# Altium footprint library domino-rising-cage-clamp.PcbLib: 435 footprints (part 17 of 28)
Each footprint in its own frame and in the unit in brackets; x right, y up, seen from the top. Pads: shape width x height; smd on the part's side, far side on the other; paste and mask are expansions set on the pad; w line width, h text height; cw(c..) or ccw(c..) is an arc to the next point about the centre after c.
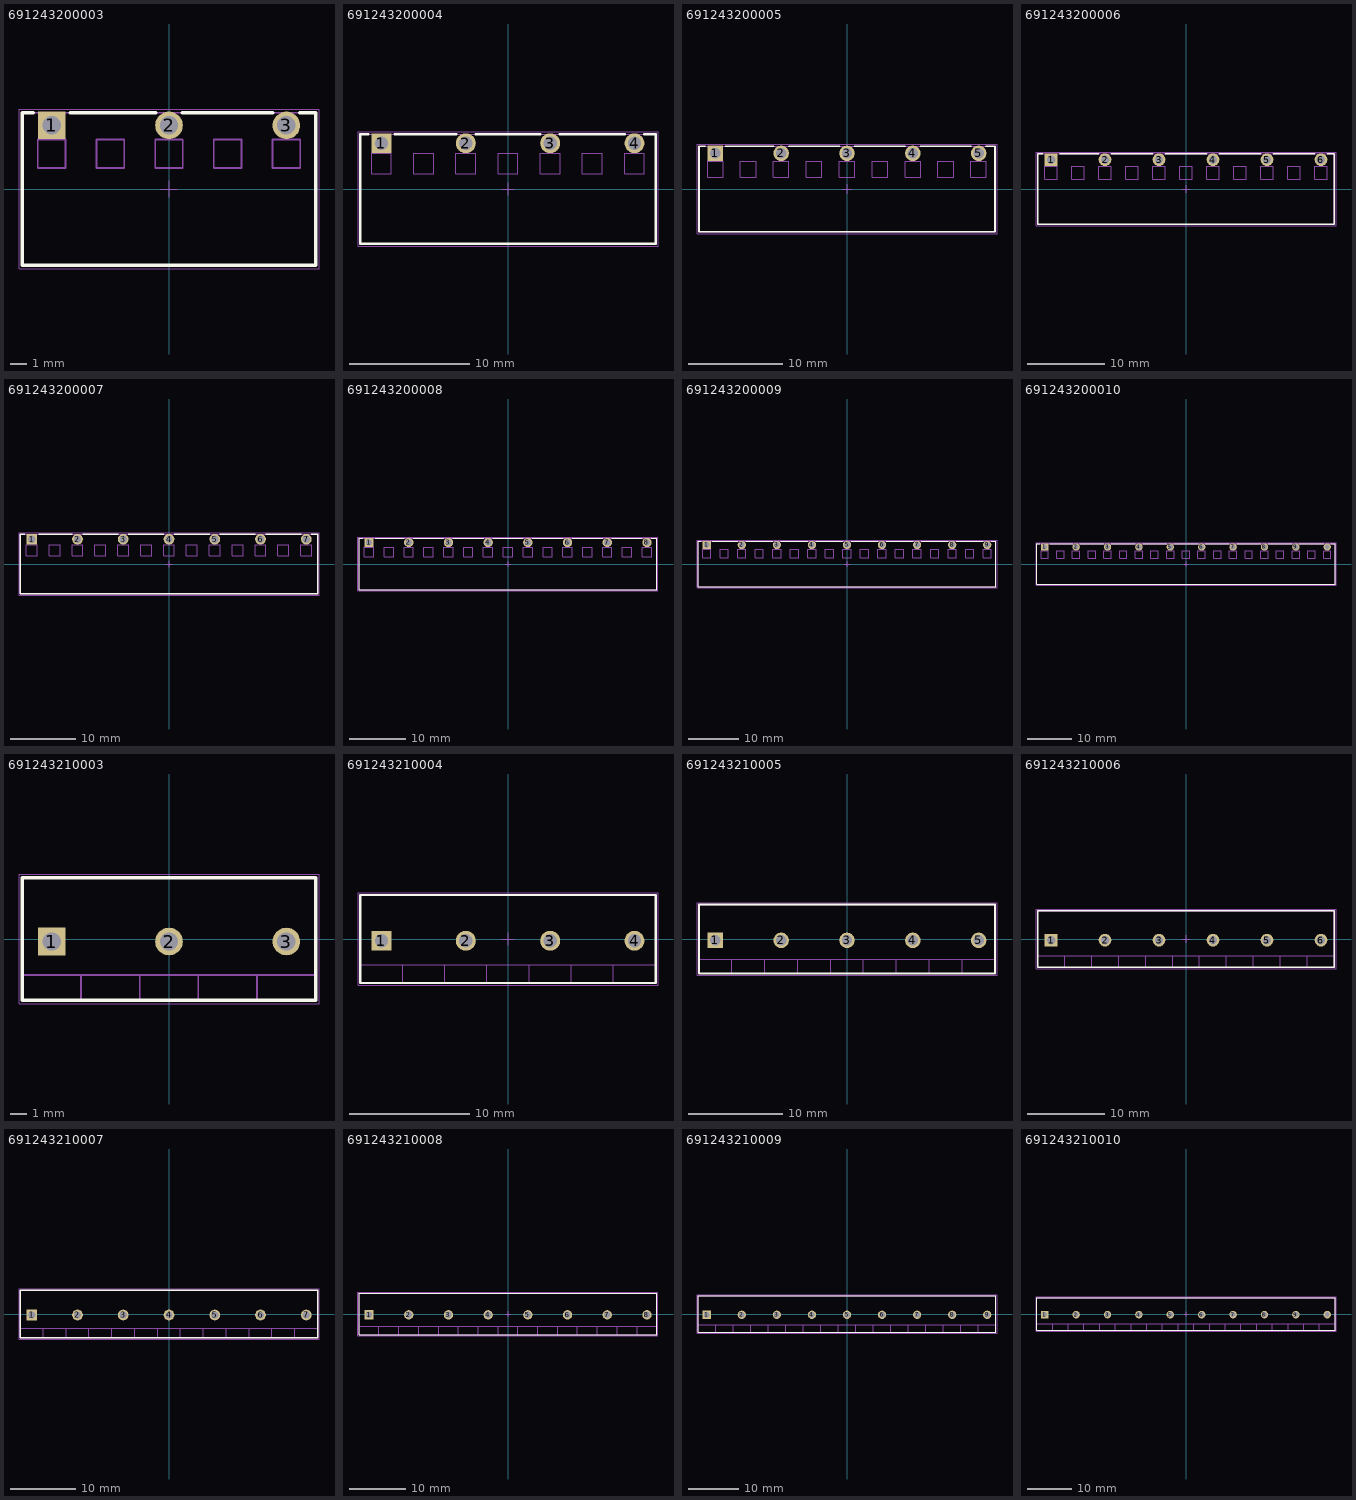
[diagram p16: the footprints below, top view; thin cyan lines are the x and y axes]

## 691243200003 [mm] "Serie 2432 - 7.00 mm _ 3 pins"
height 7.3
pads (3):
  rect 1.65x1.65 hole 1.1: 1(-7,3.8)
  round 1.65 hole 1.1: 2(0,3.8) 3(7,3.8)
Top Overlay:
  lines w0.2: -8.1,4.55 -8.75,4.55 -8.75,-4.55 8.75,-4.55 8.75,4.55 7.8,4.55 ; -5.9,4.55 -0.8,4.55 ; 0.8,4.55 6.2,4.55
Mechanical 13:
  lines w0.1: -8.75,-4.55 -8.75,4.55 8.75,4.55 8.75,-4.55 -8.75,-4.55 ; -7.825,1.25 -6.175,1.25 -6.175,2.95 -7.825,2.95 -7.825,1.25 ; -4.325,1.25 -4.325,2.95 -2.675,2.95 -2.675,1.25 -4.325,1.25 ; -0.825,1.25 -0.825,2.95 0.825,2.95 0.825,1.25 -0.825,1.25 ; 2.675,1.25 2.675,2.95 4.325,2.95 4.325,1.25 2.675,1.25 ; 6.175,1.25 6.175,2.95 7.825,2.95 7.825,1.25 6.175,1.25
Mechanical 15:
  lines w0.05: -0.5,0 0.5,0 ; 0,-0.5 0,0.5 ; -8.95,-4.75 -8.95,4.75 8.95,4.75 8.95,-4.75 -8.95,-4.75
3D body "691243200003.stp": height 7.4, standoff -3.4, extent -8.75,-4.55 8.75,4.55

## 691243200004 [mm] "Serie 2432 - 7.00 mm _ 4 pins"
height 7.3
pads (4):
  rect 1.65x1.65 hole 1.1: 1(-10.5,3.8)
  round 1.65 hole 1.1: 2(-3.5,3.8) 3(3.5,3.8) 4(10.5,3.8)
Top Overlay:
  lines w0.2: -11.6,4.55 -12.25,4.55 -12.25,-4.55 12.25,-4.55 12.25,4.55 11.3,4.55 ; -9.4,4.55 -4.3,4.55 ; -2.7,4.55 2.7,4.55 ; 4.3,4.55 9.7,4.55
Mechanical 13:
  lines w0.1: -12.25,-4.55 -12.25,4.55 12.25,4.55 12.25,-4.55 -12.25,-4.55 ; -11.325,1.25 -9.675,1.25 -9.675,2.95 -11.325,2.95 -11.325,1.25 ; -7.825,1.25 -7.825,2.95 -6.175,2.95 -6.175,1.25 -7.825,1.25 ; -4.325,1.25 -4.325,2.95 -2.675,2.95 -2.675,1.25 -4.325,1.25 ; -0.825,1.25 -0.825,2.95 0.825,2.95 0.825,1.25 -0.825,1.25 ; 2.675,1.25 2.675,2.95 4.325,2.95 4.325,1.25 2.675,1.25 ; 6.175,1.25 6.175,2.95 7.825,2.95 7.825,1.25 6.175,1.25 ; 9.675,1.25 11.325,1.25 11.325,2.95 9.675,2.95 9.675,1.25
Mechanical 15:
  lines w0.05: -0.5,0 0.5,0 ; 0,-0.5 0,0.5 ; -12.45,-4.75 -12.45,4.75 12.45,4.75 12.45,-4.75 -12.45,-4.75
3D body "691243200004.stp": height 7.4, standoff -3.4, extent -12.25,-4.55 12.25,4.55

## 691243200005 [mm] "Serie 2432 - 7.00 mm _ 5 pins"
height 7.3
pads (5):
  rect 1.65x1.65 hole 1.1: 1(-14,3.8)
  round 1.65 hole 1.1: 2(-7,3.8) 3(0,3.8) 4(7,3.8) 5(14,3.8)
Top Overlay:
  lines w0.2: -15.1,4.55 -15.75,4.55 -15.75,-4.55 15.75,-4.55 15.75,4.55 14.8,4.55 ; -12.9,4.55 -7.8,4.55 ; -6.2,4.55 -0.8,4.55 ; 0.8,4.55 6.2,4.55 ; 7.8,4.55 13.2,4.55
Mechanical 13:
  lines w0.1: -15.75,-4.55 -15.75,4.55 15.75,4.55 15.75,-4.55 -15.75,-4.55 ; -14.825,1.25 -13.175,1.25 -13.175,2.95 -14.825,2.95 -14.825,1.25 ; -11.325,1.25 -9.675,1.25 -9.675,2.95 -11.325,2.95 -11.325,1.25 ; -7.825,1.25 -7.825,2.95 -6.175,2.95 -6.175,1.25 -7.825,1.25 ; -4.325,1.25 -2.675,1.25 -2.675,2.95 -4.325,2.95 -4.325,1.25 ; -0.825,1.25 -0.825,2.95 0.825,2.95 0.825,1.25 -0.825,1.25 ; 2.675,1.25 4.325,1.25 4.325,2.95 2.675,2.95 2.675,1.25 ; 6.175,1.25 7.825,1.25 7.825,2.95 6.175,2.95 6.175,1.25 ; 9.675,1.25 11.325,1.25 11.325,2.95 9.675,2.95 9.675,1.25 ; 13.175,1.25 13.175,2.95 14.825,2.95 14.825,1.25 13.175,1.25
Mechanical 15:
  lines w0.05: -0.5,0 0.5,0 ; 0,-0.5 0,0.5 ; -15.95,-4.75 -15.95,4.75 15.95,4.75 15.95,-4.75 -15.95,-4.75
3D body "691243200005.stp": height 7.4, standoff -3.4, extent -15.75,-4.55 15.75,4.55

## 691243200006 [mm] "Serie 2432 - 7.00 mm _ 6 pins"
height 7.3
pads (6):
  rect 1.65x1.65 hole 1.1: 1(-17.5,3.8)
  round 1.65 hole 1.1: 2(-10.5,3.8) 3(-3.5,3.8) 4(3.5,3.8) 5(10.5,3.8) 6(17.5,3.8)
Top Overlay:
  lines w0.2: -18.6,4.55 -19.25,4.55 -19.25,-4.55 19.25,-4.55 19.25,4.55 18.3,4.55 ; -16.4,4.55 -11.3,4.55 ; -9.7,4.55 -4.3,4.55 ; -2.7,4.55 2.7,4.55 ; 4.3,4.55 9.7,4.55 ; 11.3,4.55 16.7,4.55
Mechanical 13:
  lines w0.1: -19.25,-4.55 -19.25,4.55 19.25,4.55 19.25,-4.55 -19.25,-4.55 ; -18.325,1.25 -16.675,1.25 -16.675,2.95 -18.325,2.95 -18.325,1.25 ; -14.825,1.25 -14.825,2.95 -13.175,2.95 -13.175,1.25 -14.825,1.25 ; -11.325,1.25 -11.325,2.95 -9.675,2.95 -9.675,1.25 -11.325,1.25 ; -7.825,1.25 -7.825,2.95 -6.175,2.95 -6.175,1.25 -7.825,1.25 ; -4.325,1.25 -4.325,2.95 -2.675,2.95 -2.675,1.25 -4.325,1.25 ; -0.825,1.25 -0.825,2.95 0.825,2.95 0.825,1.25 -0.825,1.25 ; 2.675,1.25 4.325,1.25 4.325,2.95 2.675,2.95 2.675,1.25 ; 6.175,1.25 6.175,2.95 7.825,2.95 7.825,1.25 6.175,1.25 ; 9.675,1.25 9.675,2.95 11.325,2.95 11.325,1.25 9.675,1.25 ; 13.175,1.25 13.175,2.95 14.825,2.95 14.825,1.25 13.175,1.25 ; 16.675,1.25 18.325,1.25 18.325,2.95 16.675,2.95 16.675,1.25
Mechanical 15:
  lines w0.05: -0.5,0 0.5,0 ; 0,-0.5 0,0.5 ; -19.45,-4.75 -19.45,4.75 19.45,4.75 19.45,-4.75 -19.45,-4.75
3D body "691243200006.stp": height 7.4, standoff -3.4, extent -19.25,-4.55 19.25,4.55

## 691243200007 [mm] "Serie 2432 - 7.00 mm _ 7 pins"
height 7.3
pads (7):
  rect 1.65x1.65 hole 1.1: 1(-21,3.8)
  round 1.65 hole 1.1: 2(-14,3.8) 3(-7,3.8) 4(0,3.8) 5(7,3.8) 6(14,3.8) 7(21,3.8)
Top Overlay:
  lines w0.2: -22.1,4.55 -22.75,4.55 -22.75,-4.55 22.75,-4.55 22.75,4.55 21.8,4.55 ; -19.9,4.55 -14.8,4.55 ; -13.2,4.55 -7.8,4.55 ; -6.2,4.55 -0.8,4.55 ; 0.8,4.55 6.2,4.55 ; 7.8,4.55 13.2,4.55 ; 14.8,4.55 20.2,4.55
Mechanical 13:
  lines w0.1: -22.75,-4.55 22.75,-4.55 22.75,4.55 -22.75,4.55 -22.75,-4.55 ; -21.825,1.25 -21.825,2.95 -20.175,2.95 -20.175,1.25 -21.825,1.25 ; -18.325,1.25 -18.325,2.95 -16.675,2.95 -16.675,1.25 -18.325,1.25 ; -14.825,1.25 -13.175,1.25 -13.175,2.95 -14.825,2.95 -14.825,1.25 ; -11.325,1.25 -11.325,2.95 -9.675,2.95 -9.675,1.25 -11.325,1.25 ; -7.825,1.25 -6.175,1.25 -6.175,2.95 -7.825,2.95 -7.825,1.25 ; -4.325,1.25 -4.325,2.95 -2.675,2.95 -2.675,1.25 -4.325,1.25 ; -0.825,1.25 -0.825,2.95 0.825,2.95 0.825,1.25 -0.825,1.25 ; 2.675,1.25 2.675,2.95 4.325,2.95 4.325,1.25 2.675,1.25 ; 6.175,1.25 7.825,1.25 7.825,2.95 6.175,2.95 6.175,1.25 ; 9.675,1.25 9.675,2.95 11.325,2.95 11.325,1.25 9.675,1.25 ; 13.175,1.25 13.175,2.95 14.825,2.95 14.825,1.25 13.175,1.25 ; 16.675,1.25 16.675,2.95 18.325,2.95 18.325,1.25 16.675,1.25 ; 20.175,1.25 21.825,1.25 21.825,2.95 20.175,2.95 20.175,1.25
Mechanical 15:
  lines w0.05: -0.5,0 0.5,0 ; 0,-0.5 0,0.5 ; -22.95,-4.75 22.95,-4.75 22.95,4.75 -22.95,4.75 -22.95,-4.75
3D body "691243200007.stp": height 7.4, standoff -3.4, extent -22.75,-4.55 22.75,4.55

## 691243200008 [mm] "Serie 2432 - 7.00 mm _ 8 pins"
height 7.3
pads (8):
  rect 1.65x1.65 hole 1.1: 1(-24.5,3.8)
  round 1.65 hole 1.1: 2(-17.5,3.8) 3(-10.5,3.8) 4(-3.5,3.8) 5(3.5,3.8) 6(10.5,3.8) 7(17.5,3.8) 8(24.5,3.8)
Top Overlay:
  lines w0.2: -25.6,4.55 -26.25,4.55 -26.25,-4.55 26.25,-4.55 26.25,4.55 25.3,4.55 ; -23.4,4.55 -18.3,4.55 ; -16.7,4.55 -11.3,4.55 ; -9.7,4.55 -4.3,4.55 ; -2.7,4.55 2.7,4.55 ; 4.3,4.55 9.7,4.55 ; 11.3,4.55 16.7,4.55 ; 18.3,4.55 23.7,4.55
Mechanical 13:
  lines w0.1: -26.25,-4.55 26.25,-4.55 26.25,4.55 -26.25,4.55 -26.25,-4.55 ; -25.325,1.25 -25.325,2.95 -23.675,2.95 -23.675,1.25 -25.325,1.25 ; -21.825,1.25 -20.175,1.25 -20.175,2.95 -21.825,2.95 -21.825,1.25 ; -18.325,1.25 -16.675,1.25 -16.675,2.95 -18.325,2.95 -18.325,1.25 ; -14.825,1.25 -13.175,1.25 -13.175,2.95 -14.825,2.95 -14.825,1.25 ; -11.325,1.25 -9.675,1.25 -9.675,2.95 -11.325,2.95 -11.325,1.25 ; -7.825,1.25 -6.175,1.25 -6.175,2.95 -7.825,2.95 -7.825,1.25 ; -4.325,1.25 -4.325,2.95 -2.675,2.95 -2.675,1.25 -4.325,1.25 ; -0.825,1.25 0.825,1.25 0.825,2.95 -0.825,2.95 -0.825,1.25 ; 2.675,1.25 4.325,1.25 4.325,2.95 2.675,2.95 2.675,1.25 ; 6.175,1.25 7.825,1.25 7.825,2.95 6.175,2.95 6.175,1.25 ; 9.675,1.25 9.675,2.95 11.325,2.95 11.325,1.25 9.675,1.25 ; 13.175,1.25 14.825,1.25 14.825,2.95 13.175,2.95 13.175,1.25 ; 16.675,1.25 18.325,1.25 18.325,2.95 16.675,2.95 16.675,1.25 ; 20.175,1.25 21.825,1.25 21.825,2.95 20.175,2.95 20.175,1.25 ; 23.675,1.25 23.675,2.95 25.325,2.95 25.325,1.25 23.675,1.25
Mechanical 15:
  lines w0.05: -0.5,0 0.5,0 ; 0,-0.5 0,0.5 ; -26.45,-4.75 26.45,-4.75 26.45,4.75 -26.45,4.75 -26.45,-4.75
3D body "691243200008.stp": height 7.4, standoff -3.4, extent -26.25,-4.55 26.25,4.55

## 691243200009 [mm] "Serie 2432 - 7.00 mm _ 9 pins"
height 7.3
pads (9):
  rect 1.65x1.65 hole 1.1: 1(-28,3.8)
  round 1.65 hole 1.1: 2(-21,3.8) 3(-14,3.8) 4(-7,3.8) 5(0,3.8) 6(7,3.8) 7(14,3.8) 8(21,3.8) 9(28,3.8)
Top Overlay:
  lines w0.2: -29.1,4.55 -29.75,4.55 -29.75,-4.55 29.75,-4.55 29.75,4.55 28.8,4.55 ; -26.9,4.55 -21.8,4.55 ; -20.2,4.55 -14.8,4.55 ; -13.2,4.55 -7.8,4.55 ; -6.2,4.55 -0.8,4.55 ; 0.8,4.55 6.2,4.55 ; 7.8,4.55 13.2,4.55 ; 14.8,4.55 20.2,4.55 ; 21.8,4.55 27.2,4.55
Mechanical 13:
  lines w0.1: -29.75,-4.55 29.75,-4.55 29.75,4.55 -29.75,4.55 -29.75,-4.55 ; -28.825,1.25 -28.825,2.95 -27.175,2.95 -27.175,1.25 -28.825,1.25 ; -25.325,1.25 -25.325,2.95 -23.675,2.95 -23.675,1.25 -25.325,1.25 ; -21.825,1.25 -20.175,1.25 -20.175,2.95 -21.825,2.95 -21.825,1.25 ; -18.325,1.25 -18.325,2.95 -16.675,2.95 -16.675,1.25 -18.325,1.25 ; -14.825,1.25 -13.175,1.25 -13.175,2.95 -14.825,2.95 -14.825,1.25 ; -11.325,1.25 -11.325,2.95 -9.675,2.95 -9.675,1.25 -11.325,1.25 ; -7.825,1.25 -7.825,2.95 -6.175,2.95 -6.175,1.25 -7.825,1.25 ; -4.325,1.25 -4.325,2.95 -2.675,2.95 -2.675,1.25 -4.325,1.25 ; -0.825,1.25 0.825,1.25 0.825,2.95 -0.825,2.95 -0.825,1.25 ; 2.675,1.25 2.675,2.95 4.325,2.95 4.325,1.25 2.675,1.25 ; 6.175,1.25 6.175,2.95 7.825,2.95 7.825,1.25 6.175,1.25 ; 9.675,1.25 9.675,2.95 11.325,2.95 11.325,1.25 9.675,1.25 ; 13.175,1.25 14.825,1.25 14.825,2.95 13.175,2.95 13.175,1.25 ; 16.675,1.25 16.675,2.95 18.325,2.95 18.325,1.25 16.675,1.25 ; 20.175,1.25 20.175,2.95 21.825,2.95 21.825,1.25 20.175,1.25 ; 23.675,1.25 23.675,2.95 25.325,2.95 25.325,1.25 23.675,1.25 ; 27.175,1.25 28.825,1.25 28.825,2.95 27.175,2.95 27.175,1.25
Mechanical 15:
  lines w0.05: -0.5,0 0.5,0 ; 0,-0.5 0,0.5 ; -29.95,-4.75 29.95,-4.75 29.95,4.75 -29.95,4.75 -29.95,-4.75
3D body "691243200009.stp": height 7.4, standoff -3.4, extent -29.75,-4.55 29.75,4.55

## 691243200010 [mm] "Serie 2432 - 7.00 mm _ 10 pins"
height 7.3
pads (10):
  rect 1.65x1.65 hole 1.1: 1(-31.5,3.8)
  round 1.65 hole 1.1: 2(-24.5,3.8) 3(-17.5,3.8) 4(-10.5,3.8) 5(-3.5,3.8) 6(3.5,3.8) 7(10.5,3.8) 8(17.5,3.8) 9(24.5,3.8) 10(31.5,3.8)
Top Overlay:
  lines w0.2: -32.6,4.55 -33.25,4.55 -33.25,-4.55 33.25,-4.55 33.25,4.55 32.3,4.55 ; -30.4,4.55 -25.3,4.55 ; -23.7,4.55 -18.3,4.55 ; -16.7,4.55 -11.3,4.55 ; -9.7,4.55 -4.3,4.55 ; -2.7,4.55 2.7,4.55 ; 4.3,4.55 9.7,4.55 ; 11.3,4.55 16.7,4.55 ; 18.3,4.55 23.7,4.55 ; 25.3,4.55 30.7,4.55
Mechanical 13:
  lines w0.1: -33.25,-4.55 -33.25,4.55 33.25,4.55 33.25,-4.55 -33.25,-4.55 ; -32.325,1.25 -30.675,1.25 -30.675,2.95 -32.325,2.95 -32.325,1.25 ; -28.825,1.25 -27.175,1.25 -27.175,2.95 -28.825,2.95 -28.825,1.25 ; -25.325,1.25 -25.325,2.95 -23.675,2.95 -23.675,1.25 -25.325,1.25 ; -21.825,1.25 -20.175,1.25 -20.175,2.95 -21.825,2.95 -21.825,1.25 ; -18.325,1.25 -18.325,2.95 -16.675,2.95 -16.675,1.25 -18.325,1.25 ; -14.825,1.25 -13.175,1.25 -13.175,2.95 -14.825,2.95 -14.825,1.25 ; -11.325,1.25 -9.675,1.25 -9.675,2.95 -11.325,2.95 -11.325,1.25 ; -7.825,1.25 -6.175,1.25 -6.175,2.95 -7.825,2.95 -7.825,1.25 ; -4.325,1.25 -4.325,2.95 -2.675,2.95 -2.675,1.25 -4.325,1.25 ; -0.825,1.25 0.825,1.25 0.825,2.95 -0.825,2.95 -0.825,1.25 ; 2.675,1.25 4.325,1.25 4.325,2.95 2.675,2.95 2.675,1.25 ; 6.175,1.25 7.825,1.25 7.825,2.95 6.175,2.95 6.175,1.25 ; 9.675,1.25 9.675,2.95 11.325,2.95 11.325,1.25 9.675,1.25 ; 13.175,1.25 14.825,1.25 14.825,2.95 13.175,2.95 13.175,1.25 ; 16.675,1.25 18.325,1.25 18.325,2.95 16.675,2.95 16.675,1.25 ; 20.175,1.25 21.825,1.25 21.825,2.95 20.175,2.95 20.175,1.25 ; 23.675,1.25 23.675,2.95 25.325,2.95 25.325,1.25 23.675,1.25 ; 27.175,1.25 28.825,1.25 28.825,2.95 27.175,2.95 27.175,1.25 ; 30.675,1.25 32.325,1.25 32.325,2.95 30.675,2.95 30.675,1.25
Mechanical 15:
  lines w0.05: -0.5,0 0.5,0 ; 0,-0.5 0,0.5 ; -33.45,-4.75 -33.45,4.75 33.45,4.75 33.45,-4.75 -33.45,-4.75
3D body "691243200010.stp": height 7.4, standoff -3.4, extent -33.25,-4.55 33.25,4.55

## 691243210003 [mm] "Serie 2432 - 7.00 mm _ 3 pins"
height 9.1
pads (3):
  rect 1.65x1.65 hole 1.1: 1(-7,-0.15)
  round 1.65 hole 1.1: 2(0,-0.15) 3(7,-0.15)
Top Overlay:
  lines w0.2: -8.75,-3.65 -8.75,3.65 8.75,3.65 8.75,-3.65 -8.75,-3.65
Mechanical 13:
  lines w0.1: -8.75,-2.15 8.75,-2.15 ; -5.25,-3.65 -5.25,-2.15 ; -1.75,-3.65 -1.75,-2.15 ; 1.75,-3.65 1.75,-2.15 ; 5.25,-3.65 5.25,-2.15 ; -8.75,-3.65 8.75,-3.65 8.75,3.65 -8.75,3.65 -8.75,-3.65
Mechanical 15:
  lines w0.05: -0.5,0 0.5,0 ; 0,-0.5 0,0.5 ; -8.95,-3.85 -8.95,3.85 8.95,3.85 8.95,-3.85 -8.95,-3.85
3D body "691243210003.stp": height 9.15, standoff -3.45, extent -8.75,-3.65 8.75,3.65

## 691243210004 [mm] "Serie 2432 - 7.00 mm _ 4 pins"
height 9.1
pads (4):
  rect 1.65x1.65 hole 1.1: 1(-10.5,-0.15)
  round 1.65 hole 1.1: 2(-3.5,-0.15) 3(3.5,-0.15) 4(10.5,-0.15)
Top Overlay:
  lines w0.2: -12.25,-3.65 12.25,-3.65 12.25,3.65 -12.25,3.65 -12.25,-3.65
Mechanical 13:
  lines w0.1: -12.25,-2.15 12.25,-2.15 ; -8.75,-3.65 -8.75,-2.15 ; -5.25,-3.65 -5.25,-2.15 ; -1.75,-3.65 -1.75,-2.15 ; 1.75,-3.65 1.75,-2.15 ; 5.25,-3.65 5.25,-2.15 ; 8.75,-3.65 8.75,-2.15 ; -12.25,-3.65 -12.25,3.65 12.25,3.65 12.25,-3.65 -12.25,-3.65
Mechanical 15:
  lines w0.05: -0.5,0 0.5,0 ; 0,-0.5 0,0.5 ; -12.45,-3.85 12.45,-3.85 12.45,3.85 -12.45,3.85 -12.45,-3.85
3D body "691243210004.stp": height 9.15, standoff -3.45, extent -12.25,-3.65 12.25,3.65

## 691243210005 [mm] "Serie 2432 - 7.00 mm _ 5 pins"
height 9.1
pads (5):
  rect 1.65x1.65 hole 1.1: 1(-14,-0.15)
  round 1.65 hole 1.1: 2(-7,-0.15) 3(0,-0.15) 4(7,-0.15) 5(14,-0.15)
Top Overlay:
  lines w0.2: -15.75,-3.65 15.75,-3.65 15.75,3.65 -15.75,3.65 -15.75,-3.65
Mechanical 13:
  lines w0.1: -15.75,-2.15 15.75,-2.15 ; -12.25,-3.65 -12.25,-2.15 ; -8.75,-3.65 -8.75,-2.15 ; -5.25,-3.65 -5.25,-2.15 ; -1.75,-3.65 -1.75,-2.15 ; 1.75,-3.65 1.75,-2.15 ; 5.25,-3.65 5.25,-2.15 ; 8.75,-3.65 8.75,-2.15 ; 12.25,-3.65 12.25,-2.15 ; -15.75,-3.65 -15.75,3.65 15.75,3.65 15.75,-3.65 -15.75,-3.65
Mechanical 15:
  lines w0.05: -0.5,0 0.5,0 ; 0,-0.5 0,0.5 ; -15.95,-3.85 15.95,-3.85 15.95,3.85 -15.95,3.85 -15.95,-3.85
3D body "691243210005.stp": height 9.15, standoff -3.45, extent -15.75,-3.65 15.75,3.65

## 691243210006 [mm] "Serie 2432 - 7.00 mm _ 6 pins"
height 9.1
pads (6):
  rect 1.65x1.65 hole 1.1: 1(-17.5,-0.15)
  round 1.65 hole 1.1: 2(-10.5,-0.15) 3(-3.5,-0.15) 4(3.5,-0.15) 5(10.5,-0.15) 6(17.5,-0.15)
Top Overlay:
  lines w0.2: -19.25,-3.65 19.25,-3.65 19.25,3.65 -19.25,3.65 -19.25,-3.65
Mechanical 13:
  lines w0.1: -19.25,-2.15 19.25,-2.15 ; -15.75,-3.65 -15.75,-2.15 ; -12.25,-3.65 -12.25,-2.15 ; -8.75,-3.65 -8.75,-2.15 ; -5.25,-3.65 -5.25,-2.15 ; -1.75,-3.65 -1.75,-2.15 ; 1.75,-3.65 1.75,-2.15 ; 5.25,-3.65 5.25,-2.15 ; 8.75,-3.65 8.75,-2.15 ; 12.25,-3.65 12.25,-2.15 ; 15.75,-3.65 15.75,-2.15 ; -19.25,-3.65 -19.25,3.65 19.25,3.65 19.25,-3.65 -19.25,-3.65
Mechanical 15:
  lines w0.05: -0.5,0 0.5,0 ; 0,-0.5 0,0.5 ; -19.45,-3.85 19.45,-3.85 19.45,3.85 -19.45,3.85 -19.45,-3.85
3D body "691243210006.stp": height 9.15, standoff -3.45, extent -19.25,-3.65 19.25,3.65

## 691243210007 [mm] "Serie 2432 - 7.00 mm _ 7 pins"
height 9.1
pads (7):
  rect 1.65x1.65 hole 1.1: 1(-21,-0.15)
  round 1.65 hole 1.1: 2(-14,-0.15) 3(-7,-0.15) 4(0,-0.15) 5(7,-0.15) 6(14,-0.15) 7(21,-0.15)
Top Overlay:
  lines w0.2: -22.75,-3.65 -22.75,3.65 22.75,3.65 22.75,-3.65 -22.75,-3.65
Mechanical 13:
  lines w0.1: -22.75,-2.15 22.75,-2.15 ; -19.25,-3.65 -19.25,-2.15 ; -15.75,-3.65 -15.75,-2.15 ; -12.25,-3.65 -12.25,-2.15 ; -8.75,-3.65 -8.75,-2.15 ; -5.25,-3.65 -5.25,-2.15 ; -1.75,-3.65 -1.75,-2.15 ; 1.75,-3.65 1.75,-2.15 ; 5.25,-3.65 5.25,-2.15 ; 8.75,-3.65 8.75,-2.15 ; 12.25,-3.65 12.25,-2.15 ; 15.75,-3.65 15.75,-2.15 ; 19.25,-3.65 19.25,-2.15 ; -22.75,-3.65 22.75,-3.65 22.75,3.65 -22.75,3.65 -22.75,-3.65
Mechanical 15:
  lines w0.05: -0.5,0 0.5,0 ; 0,-0.5 0,0.5 ; -22.95,-3.85 -22.95,3.85 22.95,3.85 22.95,-3.85 -22.95,-3.85
3D body "691243210007.stp": height 9.15, standoff -3.45, extent -22.75,-3.65 22.75,3.65

## 691243210008 [mm] "Serie 2432 - 7.00 mm _ 8 pins"
height 9.1
pads (8):
  rect 1.65x1.65 hole 1.1: 1(-24.5,-0.15)
  round 1.65 hole 1.1: 2(-17.5,-0.15) 3(-10.5,-0.15) 4(-3.5,-0.15) 5(3.5,-0.15) 6(10.5,-0.15) 7(17.5,-0.15) 8(24.5,-0.15)
Top Overlay:
  lines w0.2: -26.25,-3.65 26.25,-3.65 26.25,3.65 -26.25,3.65 -26.25,-3.65
Mechanical 13:
  lines w0.1: -26.25,-2.15 26.25,-2.15 ; -22.75,-3.65 -22.75,-2.15 ; -19.25,-3.65 -19.25,-2.15 ; -15.75,-3.65 -15.75,-2.15 ; -12.25,-3.65 -12.25,-2.15 ; -8.75,-3.65 -8.75,-2.15 ; -5.25,-3.65 -5.25,-2.15 ; -1.75,-3.65 -1.75,-2.15 ; 1.75,-3.65 1.75,-2.15 ; 5.25,-3.65 5.25,-2.15 ; 8.75,-3.65 8.75,-2.15 ; 12.25,-3.65 12.25,-2.15 ; 15.75,-3.65 15.75,-2.15 ; 19.25,-3.65 19.25,-2.15 ; 22.75,-3.65 22.75,-2.15 ; -26.25,-3.65 -26.25,3.65 26.25,3.65 26.25,-3.65 -26.25,-3.65
Mechanical 15:
  lines w0.05: -0.5,0 0.5,0 ; 0,-0.5 0,0.5 ; -26.45,-3.85 26.45,-3.85 26.45,3.85 -26.45,3.85 -26.45,-3.85
3D body "691243210008.stp": height 9.15, standoff -3.45, extent -26.25,-3.65 26.25,3.65

## 691243210009 [mm] "Serie 2432 - 7.00 mm _ 9 pins"
height 9.1
pads (9):
  rect 1.65x1.65 hole 1.1: 1(-28,-0.15)
  round 1.65 hole 1.1: 2(-21,-0.15) 3(-14,-0.15) 4(-7,-0.15) 5(0,-0.15) 6(7,-0.15) 7(14,-0.15) 8(21,-0.15) 9(28,-0.15)
Top Overlay:
  lines w0.2: -29.75,-3.65 29.75,-3.65 29.75,3.65 -29.75,3.65 -29.75,-3.65
Mechanical 13:
  lines w0.1: -29.75,-2.15 29.75,-2.15 ; -26.25,-3.65 -26.25,-2.15 ; -22.75,-3.65 -22.75,-2.15 ; -19.25,-3.65 -19.25,-2.15 ; -15.75,-3.65 -15.75,-2.15 ; -12.25,-3.65 -12.25,-2.15 ; -8.75,-3.65 -8.75,-2.15 ; -5.25,-3.65 -5.25,-2.15 ; -1.75,-3.65 -1.75,-2.15 ; 1.75,-3.65 1.75,-2.15 ; 5.25,-3.65 5.25,-2.15 ; 8.75,-3.65 8.75,-2.15 ; 12.25,-3.65 12.25,-2.15 ; 15.75,-3.65 15.75,-2.15 ; 19.25,-3.65 19.25,-2.15 ; 22.75,-3.65 22.75,-2.15 ; 26.25,-3.65 26.25,-2.15 ; -29.75,-3.65 -29.75,3.65 29.75,3.65 29.75,-3.65 -29.75,-3.65
Mechanical 15:
  lines w0.05: -0.5,0 0.5,0 ; 0,-0.5 0,0.5 ; -29.95,-3.85 29.95,-3.85 29.95,3.85 -29.95,3.85 -29.95,-3.85
3D body "691243210009.stp": height 9.15, standoff -3.45, extent -29.75,-3.65 29.75,3.65

## 691243210010 [mm] "Serie 2432 - 7.00 mm _ 10 pins"
height 9.1
pads (10):
  rect 1.65x1.65 hole 1.1: 1(-31.5,-0.15)
  round 1.65 hole 1.1: 2(-24.5,-0.15) 3(-17.5,-0.15) 4(-10.5,-0.15) 5(-3.5,-0.15) 6(3.5,-0.15) 7(10.5,-0.15) 8(17.5,-0.15) 9(24.5,-0.15) 10(31.5,-0.15)
Top Overlay:
  lines w0.2: -33.25,-3.65 -33.25,3.65 33.25,3.65 33.25,-3.65 -33.25,-3.65
Mechanical 13:
  lines w0.1: -33.25,-2.15 33.25,-2.15 ; -29.75,-3.65 -29.75,-2.15 ; -26.25,-3.65 -26.25,-2.15 ; -22.75,-3.65 -22.75,-2.15 ; -19.25,-3.65 -19.25,-2.15 ; -15.75,-3.65 -15.75,-2.15 ; -12.25,-3.65 -12.25,-2.15 ; -8.75,-3.65 -8.75,-2.15 ; -5.25,-3.65 -5.25,-2.15 ; -1.75,-3.65 -1.75,-2.15 ; 1.75,-3.65 1.75,-2.15 ; 5.25,-3.65 5.25,-2.15 ; 8.75,-3.65 8.75,-2.15 ; 12.25,-3.65 12.25,-2.15 ; 15.75,-3.65 15.75,-2.15 ; 19.25,-3.65 19.25,-2.15 ; 22.75,-3.65 22.75,-2.15 ; 26.25,-3.65 26.25,-2.15 ; 29.75,-3.65 29.75,-2.15 ; -33.25,-3.65 33.25,-3.65 33.25,3.65 -33.25,3.65 -33.25,-3.65
Mechanical 15:
  lines w0.05: -0.5,0 0.5,0 ; 0,-0.5 0,0.5 ; -33.45,-3.85 -33.45,3.85 33.45,3.85 33.45,-3.85 -33.45,-3.85
3D body "691243210010.stp": height 9.15, standoff -3.45, extent -33.25,-3.65 33.25,3.65